# Altium schematic symbol library MiscPower.SchLib: 1552 symbols (part 10 of 22) (continued)
## LM3678SDX-1.2/NOPB (continued)

## LM3679TL-1.8/NOPB
designator U?
3MHz, 350mA Miniature Step-Down DC-DC Converter for Ultra Low Profile Applications (Height < 0.55mm), 5-pin Micro SMD, Pb-Free; PartNumber: LM3679TL-1.8/NOPB; Manufacturer: National Semiconductor; PackageTopMarking: XV*I F; PowerWise: Y; CompType: MiscPower; DatasheetVersion: Feb-2008; PackageVersion: revC, Feb-2005; PackageReference: TLA05EFA; PackageDescription: Thin Micro SMD, 5 Bump (Large), 0.5mm Pitch; RoHS: Y; PinCount: 5; High-Reliability: Y; ComponentLink1Description: Manufacturer URL; ComponentLink1URL: http://www.national.com/; ComponentLink2Description: LM3679 Datasheet; ComponentLink2URL: http://www.national.com/ds/LM/LM3679.pdf; ComponentLink3Description: LM3679 Web Page; ComponentLink3URL: http://www.national.com/pf/LM/LM3679.html; ComponentLink4Description: TLA05EFA Package Page; ComponentLink4URL: http://www.national.com/packaging/folders/tla05efa.html
footprint TLA05EFA (Micro SMD, 5-Leads, Body 1.49x1.11mm, Pitch 0.5mm, NSC Recommended)
pins: A1 VIN (power), A3 GND (power), B2 SW (power), C1 EN (in), C3 FB (in)

## LM3679TLX-1.8/NOPB
designator U?
3MHz, 350mA Miniature Step-Down DC-DC Converter for Ultra Low Profile Applications (Height < 0.55mm), 5-pin Micro SMD, Pb-Free; PartNumber: LM3679TLX-1.8/NOPB; Manufacturer: National Semiconductor; PackageTopMarking: XV*I F; PowerWise: Y; CompType: MiscPower; DatasheetVersion: Feb-2008; PackageVersion: revC, Feb-2005; PackageReference: TLA05EFA; PackageDescription: Thin Micro SMD, 5 Bump (Large), 0.5mm Pitch; RoHS: Y; PinCount: 5; High-Reliability: Y; ComponentLink1Description: Manufacturer URL; ComponentLink1URL: http://www.national.com/; ComponentLink2Description: LM3679 Datasheet; ComponentLink2URL: http://www.national.com/ds/LM/LM3679.pdf; ComponentLink3Description: LM3679 Web Page; ComponentLink3URL: http://www.national.com/pf/LM/LM3679.html; ComponentLink4Description: TLA05EFA Package Page; ComponentLink4URL: http://www.national.com/packaging/folders/tla05efa.html
footprint TLA05EFA (Micro SMD, 5-Leads, Body 1.49x1.11mm, Pitch 0.5mm, NSC Recommended)
pins: A1 VIN (power), A3 GND (power), B2 SW (power), C1 EN (in), C3 FB (in)

## LM3679UR-1.2/NOPB
designator U?
3MHz, 350mA Miniature Step-Down DC-DC Converter for Ultra Low Profile Applications (Height < 0.55mm), 5-pin Micro SMD, Pb-Free; PartNumber: LM3679UR-1.2/NOPB; Manufacturer: National Semiconductor; PackageTopMarking: XV*I Z; PowerWise: N; CompType: MiscPower; High-Reliability: Y; DatasheetVersion: Feb-2008; PackageVersion: Feb-2008; PackageReference: URA05HHA; PackageDescription: Ultra Thin Micro SMD, 5 Bump (Large), 0.5mm Pitch; RoHS: Y; PinCount: 5; ComponentLink1Description: Manufacturer URL; ComponentLink1URL: http://www.national.com/; ComponentLink2Description: LM3679 Datasheet; ComponentLink2URL: http://www.national.com/ds/LM/LM3679.pdf; ComponentLink3Description: LM3679 Web Page; ComponentLink3URL: http://www.national.com/pf/LM/LM3679.html; ComponentLink4Description: URA05HHA Package Page; ComponentLink4URL: http://www.national.com/packaging/folders/ura05hha.html
footprint URA05HHA (Micro SMD, 5-Leads, Body 1.5x1.13mm, Pitch 0.5mm, NSC Recommended)
pins: A1 VIN (power), A3 GND (power), B2 SW (power), C1 EN (in), C3 FB (in)

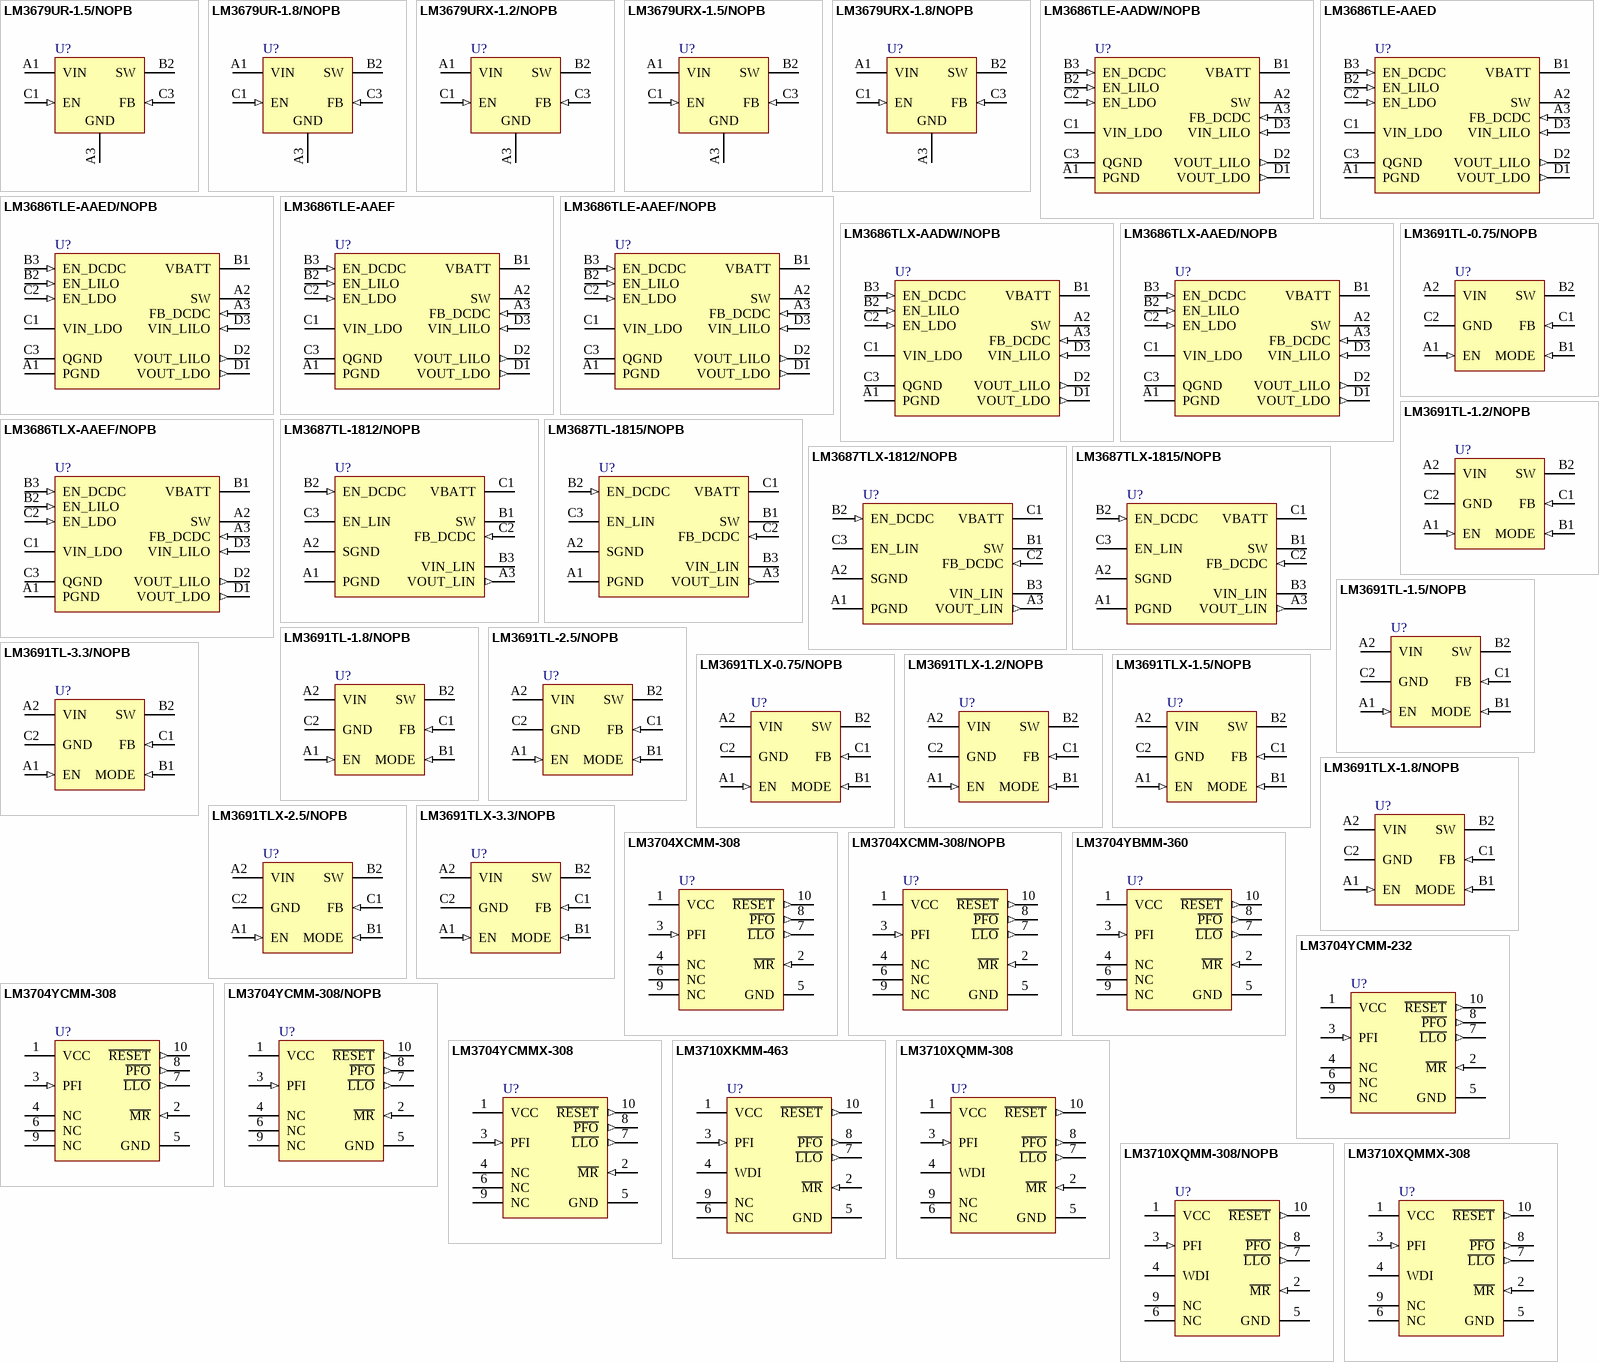
[diagram p23: symbols LM3679UR-1.5/NOPB to LM3710XQMMX-308]

## LM3679UR-1.5/NOPB
designator U?
3MHz, 350mA Miniature Step-Down DC-DC Converter for Ultra Low Profile Applications (Height < 0.55mm), 5-pin Micro SMD, Pb-Free; PartNumber: LM3679UR-1.5/NOPB; Manufacturer: National Semiconductor; PackageTopMarking: XV*I 4; PowerWise: N; CompType: MiscPower; High-Reliability: Y; DatasheetVersion: Feb-2008; PackageVersion: Feb-2008; PackageReference: URA05HHA; PackageDescription: Ultra Thin Micro SMD, 5 Bump (Large), 0.5mm Pitch; RoHS: Y; PinCount: 5; ComponentLink1Description: Manufacturer URL; ComponentLink1URL: http://www.national.com/; ComponentLink2Description: LM3679 Datasheet; ComponentLink2URL: http://www.national.com/ds/LM/LM3679.pdf; ComponentLink3Description: LM3679 Web Page; ComponentLink3URL: http://www.national.com/pf/LM/LM3679.html; ComponentLink4Description: URA05HHA Package Page; ComponentLink4URL: http://www.national.com/packaging/folders/ura05hha.html
footprint URA05HHA (Micro SMD, 5-Leads, Body 1.5x1.13mm, Pitch 0.5mm, NSC Recommended)
pins: A1 VIN (power), A3 GND (power), B2 SW (power), C1 EN (in), C3 FB (in)

## LM3679UR-1.8/NOPB
designator U?
3MHz, 350mA Miniature Step-Down DC-DC Converter for Ultra Low Profile Applications (Height < 0.55mm), 5-pin Micro SMD, Pb-Free; PartNumber: LM3679UR-1.8/NOPB; Manufacturer: National Semiconductor; PackageTopMarking: XV*I R; PowerWise: Y; CompType: MiscPower; DatasheetVersion: Feb-2008; PackageVersion: Feb-2008; PackageReference: URA05HHA; PackageDescription: Ultra Thin Micro SMD, 5 Bump (Large), 0.5mm Pitch; RoHS: Y; PinCount: 5; High-Reliability: Y; ComponentLink1Description: Manufacturer URL; ComponentLink1URL: http://www.national.com/; ComponentLink2Description: LM3679 Datasheet; ComponentLink2URL: http://www.national.com/ds/LM/LM3679.pdf; ComponentLink3Description: LM3679 Web Page; ComponentLink3URL: http://www.national.com/pf/LM/LM3679.html; ComponentLink4Description: URA05HHA Package Page; ComponentLink4URL: http://www.national.com/packaging/folders/ura05hha.html
footprint URA05HHA (Micro SMD, 5-Leads, Body 1.5x1.13mm, Pitch 0.5mm, NSC Recommended)
pins: A1 VIN (power), A3 GND (power), B2 SW (power), C1 EN (in), C3 FB (in)

## LM3679URX-1.2/NOPB
designator U?
3MHz, 350mA Miniature Step-Down DC-DC Converter for Ultra Low Profile Applications (Height < 0.55mm), 5-pin Micro SMD, Pb-Free; PartNumber: LM3679URX-1.2/NOPB; Manufacturer: National Semiconductor; PackageTopMarking: XV*I Z; PowerWise: N; CompType: MiscPower; High-Reliability: Y; DatasheetVersion: Feb-2008; PackageVersion: Feb-2008; PackageReference: URA05HHA; PackageDescription: Ultra Thin Micro SMD, 5 Bump (Large), 0.5mm Pitch; RoHS: Y; PinCount: 5; ComponentLink1Description: Manufacturer URL; ComponentLink1URL: http://www.national.com/; ComponentLink2Description: LM3679 Datasheet; ComponentLink2URL: http://www.national.com/ds/LM/LM3679.pdf; ComponentLink3Description: LM3679 Web Page; ComponentLink3URL: http://www.national.com/pf/LM/LM3679.html; ComponentLink4Description: URA05HHA Package Page; ComponentLink4URL: http://www.national.com/packaging/folders/ura05hha.html
footprint URA05HHA (Micro SMD, 5-Leads, Body 1.5x1.13mm, Pitch 0.5mm, NSC Recommended)
pins: A1 VIN (power), A3 GND (power), B2 SW (power), C1 EN (in), C3 FB (in)

## LM3679URX-1.5/NOPB
designator U?
3MHz, 350mA Miniature Step-Down DC-DC Converter for Ultra Low Profile Applications (Height < 0.55mm), 5-pin Micro SMD, Pb-Free; PartNumber: LM3679URX-1.5/NOPB; Manufacturer: National Semiconductor; PackageTopMarking: XV*I 4; PowerWise: N; CompType: MiscPower; High-Reliability: Y; DatasheetVersion: Feb-2008; PackageVersion: Feb-2008; PackageReference: URA05HHA; PackageDescription: Ultra Thin Micro SMD, 5 Bump (Large), 0.5mm Pitch; RoHS: Y; PinCount: 5; ComponentLink1Description: Manufacturer URL; ComponentLink1URL: http://www.national.com/; ComponentLink2Description: LM3679 Datasheet; ComponentLink2URL: http://www.national.com/ds/LM/LM3679.pdf; ComponentLink3Description: LM3679 Web Page; ComponentLink3URL: http://www.national.com/pf/LM/LM3679.html; ComponentLink4Description: URA05HHA Package Page; ComponentLink4URL: http://www.national.com/packaging/folders/ura05hha.html
footprint URA05HHA (Micro SMD, 5-Leads, Body 1.5x1.13mm, Pitch 0.5mm, NSC Recommended)
pins: A1 VIN (power), A3 GND (power), B2 SW (power), C1 EN (in), C3 FB (in)

## LM3679URX-1.8/NOPB
designator U?
3MHz, 350mA Miniature Step-Down DC-DC Converter for Ultra Low Profile Applications (Height < 0.55mm), 5-pin Micro SMD, Pb-Free; PartNumber: LM3679URX-1.8/NOPB; Manufacturer: National Semiconductor; PackageTopMarking: XV*I R; PowerWise: Y; CompType: MiscPower; DatasheetVersion: Feb-2008; PackageVersion: Feb-2008; PackageReference: URA05HHA; PackageDescription: Ultra Thin Micro SMD, 5 Bump (Large), 0.5mm Pitch; RoHS: Y; PinCount: 5; High-Reliability: Y; ComponentLink1Description: Manufacturer URL; ComponentLink1URL: http://www.national.com/; ComponentLink2Description: LM3679 Datasheet; ComponentLink2URL: http://www.national.com/ds/LM/LM3679.pdf; ComponentLink3Description: LM3679 Web Page; ComponentLink3URL: http://www.national.com/pf/LM/LM3679.html; ComponentLink4Description: URA05HHA Package Page; ComponentLink4URL: http://www.national.com/packaging/folders/ura05hha.html
footprint URA05HHA (Micro SMD, 5-Leads, Body 1.5x1.13mm, Pitch 0.5mm, NSC Recommended)
pins: A1 VIN (power), A3 GND (power), B2 SW (power), C1 EN (in), C3 FB (in)

## LM3686TLE-AADW/NOPB
designator U?
Step-Down DC-DC Converter with Integrated Post Linear Regulators System and Low-Noise Linear Regulator, 12-pin Micro SMD, Pb-Free; PartNumber: LM3686TLE-AADW/NOPB; Manufacturer: National Semiconductor; PackageTopMarking: XYTT*I SUEB; PowerWise: N; CompType: MiscPower; High-Reliability: Y; DatasheetVersion: Dec-2008; PackageVersion: revC, Jan-2004; PackageReference: TLA12HTA; PackageDescription: Thin Micro SMD, 12 Bump (Large), Area Array, 0.5mm Pitch; RoHS: Y; PinCount: 12; Code_JEDEC: MO-211-DE; ComponentLink1Description: Manufacturer URL; ComponentLink1URL: http://www.national.com/; ComponentLink2Description: LM3686 Datasheet; ComponentLink2URL: http://www.national.com/ds/LM/LM3686.pdf; ComponentLink3Description: LM3686 Web Page; ComponentLink3URL: http://www.national.com/pf/LM/LM3686.html; ComponentLink4Description: TLA12HTA Package Page; ComponentLink4URL: http://www.national.com/packaging/folders/tla12hta.html
footprint TLA12HTA (Micro SMD, 12-Leads, Body 2.43x1.69mm, Pitch 0.5mm, NSC Recommended)
pins: A1 PGND (power), A2 SW (power), A3 FB_DCDC (in), B1 VBATT (power), B2 EN_LILO (in), B3 EN_DCDC (in), C1 VIN_LDO (power), C2 EN_LDO (in), C3 QGND (power), D1 VOUT_LDO (out), D2 VOUT_LILO (out), D3 VIN_LILO (in)

## LM3686TLE-AAED
designator U?
Step-Down DC-DC Converter with Integrated Post Linear Regulators System and Low-Noise Linear Regulator, 12-pin Micro SMD; PartNumber: LM3686TLE-AAED; Manufacturer: National Semiconductor; PackageTopMarking: XYTT*I SXTB; PowerWise: N; CompType: MiscPower; High-Reliability: Y; DatasheetVersion: Dec-2008; PackageVersion: revC, Jan-2004; PackageReference: TLA12HTA; PackageDescription: Thin Micro SMD, 12 Bump (Large), Area Array, 0.5mm Pitch; RoHS: Y; PinCount: 12; Code_JEDEC: MO-211-DE; ComponentLink1Description: Manufacturer URL; ComponentLink1URL: http://www.national.com/; ComponentLink2Description: LM3686 Datasheet; ComponentLink2URL: http://www.national.com/ds/LM/LM3686.pdf; ComponentLink3Description: LM3686 Web Page; ComponentLink3URL: http://www.national.com/pf/LM/LM3686.html; ComponentLink4Description: TLA12HTA Package Page; ComponentLink4URL: http://www.national.com/packaging/folders/tla12hta.html
footprint TLA12HTA (Micro SMD, 12-Leads, Body 2.43x1.69mm, Pitch 0.5mm, NSC Recommended)
pins: A1 PGND (power), A2 SW (power), A3 FB_DCDC (in), B1 VBATT (power), B2 EN_LILO (in), B3 EN_DCDC (in), C1 VIN_LDO (power), C2 EN_LDO (in), C3 QGND (power), D1 VOUT_LDO (out), D2 VOUT_LILO (out), D3 VIN_LILO (in)

## LM3686TLE-AAED/NOPB
designator U?
Step-Down DC-DC Converter with Integrated Post Linear Regulators System and Low-Noise Linear Regulator, 12-pin Micro SMD, Pb-Free; PartNumber: LM3686TLE-AAED/NOPB; Manufacturer: National Semiconductor; PackageTopMarking: XYTT*I SXTB; PowerWise: N; CompType: MiscPower; High-Reliability: Y; DatasheetVersion: Dec-2008; PackageVersion: revC, Jan-2004; PackageReference: TLA12HTA; PackageDescription: Thin Micro SMD, 12 Bump (Large), Area Array, 0.5mm Pitch; RoHS: Y; PinCount: 12; Code_JEDEC: MO-211-DE; ComponentLink1Description: Manufacturer URL; ComponentLink1URL: http://www.national.com/; ComponentLink2Description: LM3686 Datasheet; ComponentLink2URL: http://www.national.com/ds/LM/LM3686.pdf; ComponentLink3Description: LM3686 Web Page; ComponentLink3URL: http://www.national.com/pf/LM/LM3686.html; ComponentLink4Description: TLA12HTA Package Page; ComponentLink4URL: http://www.national.com/packaging/folders/tla12hta.html
footprint TLA12HTA (Micro SMD, 12-Leads, Body 2.43x1.69mm, Pitch 0.5mm, NSC Recommended)
pins: A1 PGND (power), A2 SW (power), A3 FB_DCDC (in), B1 VBATT (power), B2 EN_LILO (in), B3 EN_DCDC (in), C1 VIN_LDO (power), C2 EN_LDO (in), C3 QGND (power), D1 VOUT_LDO (out), D2 VOUT_LILO (out), D3 VIN_LILO (in)

## LM3686TLE-AAEF
designator U?
Step-Down DC-DC Converter with Integrated Post Linear Regulators System and Low-Noise Linear Regulator, 12-pin Micro SMD; PartNumber: LM3686TLE-AAEF; Manufacturer: National Semiconductor; PackageTopMarking: XYTT*I SXZB; PowerWise: N; CompType: MiscPower; High-Reliability: Y; DatasheetVersion: Dec-2008; PackageVersion: revC, Jan-2004; PackageReference: TLA12HTA; PackageDescription: Thin Micro SMD, 12 Bump (Large), Area Array, 0.5mm Pitch; RoHS: Y; PinCount: 12; Code_JEDEC: MO-211-DE; ComponentLink1Description: Manufacturer URL; ComponentLink1URL: http://www.national.com/; ComponentLink2Description: LM3686 Datasheet; ComponentLink2URL: http://www.national.com/ds/LM/LM3686.pdf; ComponentLink3Description: LM3686 Web Page; ComponentLink3URL: http://www.national.com/pf/LM/LM3686.html; ComponentLink4Description: TLA12HTA Package Page; ComponentLink4URL: http://www.national.com/packaging/folders/tla12hta.html
footprint TLA12HTA (Micro SMD, 12-Leads, Body 2.43x1.69mm, Pitch 0.5mm, NSC Recommended)
pins: A1 PGND (power), A2 SW (power), A3 FB_DCDC (in), B1 VBATT (power), B2 EN_LILO (in), B3 EN_DCDC (in), C1 VIN_LDO (power), C2 EN_LDO (in), C3 QGND (power), D1 VOUT_LDO (out), D2 VOUT_LILO (out), D3 VIN_LILO (in)

## LM3686TLE-AAEF/NOPB
designator U?
Step-Down DC-DC Converter with Integrated Post Linear Regulators System and Low-Noise Linear Regulator, 12-pin Micro SMD, Pb-Free; PartNumber: LM3686TLE-AAEF/NOPB; Manufacturer: National Semiconductor; PackageTopMarking: XYTT*I SXZB; PowerWise: N; CompType: MiscPower; High-Reliability: Y; DatasheetVersion: Dec-2008; PackageVersion: revC, Jan-2004; PackageReference: TLA12HTA; PackageDescription: Thin Micro SMD, 12 Bump (Large), Area Array, 0.5mm Pitch; RoHS: Y; PinCount: 12; Code_JEDEC: MO-211-DE; ComponentLink1Description: Manufacturer URL; ComponentLink1URL: http://www.national.com/; ComponentLink2Description: LM3686 Datasheet; ComponentLink2URL: http://www.national.com/ds/LM/LM3686.pdf; ComponentLink3Description: LM3686 Web Page; ComponentLink3URL: http://www.national.com/pf/LM/LM3686.html; ComponentLink4Description: TLA12HTA Package Page; ComponentLink4URL: http://www.national.com/packaging/folders/tla12hta.html
footprint TLA12HTA (Micro SMD, 12-Leads, Body 2.43x1.69mm, Pitch 0.5mm, NSC Recommended)
pins: A1 PGND (power), A2 SW (power), A3 FB_DCDC (in), B1 VBATT (power), B2 EN_LILO (in), B3 EN_DCDC (in), C1 VIN_LDO (power), C2 EN_LDO (in), C3 QGND (power), D1 VOUT_LDO (out), D2 VOUT_LILO (out), D3 VIN_LILO (in)

## LM3686TLX-AADW/NOPB
designator U?
Step-Down DC-DC Converter with Integrated Post Linear Regulators System and Low-Noise Linear Regulator, 12-pin Micro SMD, Pb-Free; PartNumber: LM3686TLX-AADW/NOPB; Manufacturer: National Semiconductor; PackageTopMarking: XYTT*I SUEB; PowerWise: N; CompType: MiscPower; High-Reliability: Y; DatasheetVersion: Dec-2008; PackageVersion: revC, Jan-2004; PackageReference: TLA12HTA; PackageDescription: Thin Micro SMD, 12 Bump (Large), Area Array, 0.5mm Pitch; RoHS: Y; PinCount: 12; Code_JEDEC: MO-211-DE; ComponentLink1Description: Manufacturer URL; ComponentLink1URL: http://www.national.com/; ComponentLink2Description: LM3686 Datasheet; ComponentLink2URL: http://www.national.com/ds/LM/LM3686.pdf; ComponentLink3Description: LM3686 Web Page; ComponentLink3URL: http://www.national.com/pf/LM/LM3686.html; ComponentLink4Description: TLA12HTA Package Page; ComponentLink4URL: http://www.national.com/packaging/folders/tla12hta.html
footprint TLA12HTA (Micro SMD, 12-Leads, Body 2.43x1.69mm, Pitch 0.5mm, NSC Recommended)
pins: A1 PGND (power), A2 SW (power), A3 FB_DCDC (in), B1 VBATT (power), B2 EN_LILO (in), B3 EN_DCDC (in), C1 VIN_LDO (power), C2 EN_LDO (in), C3 QGND (power), D1 VOUT_LDO (out), D2 VOUT_LILO (out), D3 VIN_LILO (in)

## LM3686TLX-AAED/NOPB
designator U?
Step-Down DC-DC Converter with Integrated Post Linear Regulators System and Low-Noise Linear Regulator, 12-pin Micro SMD, Pb-Free; PartNumber: LM3686TLX-AAED/NOPB; Manufacturer: National Semiconductor; PackageTopMarking: XYTT*I SXTB; PowerWise: N; CompType: MiscPower; High-Reliability: Y; DatasheetVersion: Dec-2008; PackageVersion: revC, Jan-2004; PackageReference: TLA12HTA; PackageDescription: Thin Micro SMD, 12 Bump (Large), Area Array, 0.5mm Pitch; RoHS: Y; PinCount: 12; Code_JEDEC: MO-211-DE; ComponentLink1Description: Manufacturer URL; ComponentLink1URL: http://www.national.com/; ComponentLink2Description: LM3686 Datasheet; ComponentLink2URL: http://www.national.com/ds/LM/LM3686.pdf; ComponentLink3Description: LM3686 Web Page; ComponentLink3URL: http://www.national.com/pf/LM/LM3686.html; ComponentLink4Description: TLA12HTA Package Page; ComponentLink4URL: http://www.national.com/packaging/folders/tla12hta.html
footprint TLA12HTA (Micro SMD, 12-Leads, Body 2.43x1.69mm, Pitch 0.5mm, NSC Recommended)
pins: A1 PGND (power), A2 SW (power), A3 FB_DCDC (in), B1 VBATT (power), B2 EN_LILO (in), B3 EN_DCDC (in), C1 VIN_LDO (power), C2 EN_LDO (in), C3 QGND (power), D1 VOUT_LDO (out), D2 VOUT_LILO (out), D3 VIN_LILO (in)

## LM3686TLX-AAEF/NOPB
designator U?
Step-Down DC-DC Converter with Integrated Post Linear Regulators System and Low-Noise Linear Regulator, 12-pin Micro SMD, Pb-Free; PartNumber: LM3686TLX-AAEF/NOPB; Manufacturer: National Semiconductor; PackageTopMarking: XYTT*I SXZB; PowerWise: N; CompType: MiscPower; High-Reliability: Y; DatasheetVersion: Dec-2008; PackageVersion: revC, Jan-2004; PackageReference: TLA12HTA; PackageDescription: Thin Micro SMD, 12 Bump (Large), Area Array, 0.5mm Pitch; RoHS: Y; PinCount: 12; Code_JEDEC: MO-211-DE; ComponentLink1Description: Manufacturer URL; ComponentLink1URL: http://www.national.com/; ComponentLink2Description: LM3686 Datasheet; ComponentLink2URL: http://www.national.com/ds/LM/LM3686.pdf; ComponentLink3Description: LM3686 Web Page; ComponentLink3URL: http://www.national.com/pf/LM/LM3686.html; ComponentLink4Description: TLA12HTA Package Page; ComponentLink4URL: http://www.national.com/packaging/folders/tla12hta.html
footprint TLA12HTA (Micro SMD, 12-Leads, Body 2.43x1.69mm, Pitch 0.5mm, NSC Recommended)
pins: A1 PGND (power), A2 SW (power), A3 FB_DCDC (in), B1 VBATT (power), B2 EN_LILO (in), B3 EN_DCDC (in), C1 VIN_LDO (power), C2 EN_LDO (in), C3 QGND (power), D1 VOUT_LDO (out), D2 VOUT_LILO (out), D3 VIN_LILO (in)

## LM3687TL-1812/NOPB
designator U?
Step-Down DC-DC Converter with Integrated Low Dropout Regulator and Startup Mode, 9-pin Micro SMD, Pb-Free; PartNumber: LM3687TL-1812/NOPB; Manufacturer: National Semiconductor; PackageTopMarking: XV*I SB; PowerWise: N; CompType: MiscPower; High-Reliability: Y; DatasheetVersion: Jul-2008; PackageVersion: revC, Jan-2004; PackageReference: TLA09BBA; PackageDescription: Thin Micro SMD, 9 Bump (Large), 0.5mm Pitch; RoHS: Y; PinCount: 9; Code_JEDEC: MO-211-DD; ComponentLink1Description: Manufacturer URL; ComponentLink1URL: http://www.national.com/; ComponentLink2Description: LM3687 Datasheet; ComponentLink2URL: http://www.national.com/ds/LM/LM3687.pdf; ComponentLink3Description: LM3687 Web Page; ComponentLink3URL: http://www.national.com/pf/LM/LM3687.html; ComponentLink4Description: TLA09BBA Package Page; ComponentLink4URL: http://www.national.com/packaging/folders/tla09bba.html
footprint TLA09BBA (Micro SMD, 9-Leads, Body 1.54x1.54mm, Pitch 0.5mm, NSC Recommended)
pins: A1 PGND (power), A2 SGND (power), A3 VOUT_LIN (out), B1 SW (power), B2 EN_DCDC (in), B3 VIN_LIN (power), C1 VBATT (power), C2 FB_DCDC (in), C3 EN_LIN (power)

## LM3687TL-1815/NOPB
designator U?
Step-Down DC-DC Converter with Integrated Low Dropout Regulator and Startup Mode, 9-pin Micro SMD, Pb-Free; PartNumber: LM3687TL-1815/NOPB; Manufacturer: National Semiconductor; PackageTopMarking: XV*I S9; PowerWise: Y; CompType: MiscPower; DatasheetVersion: Jul-2008; PackageVersion: revC, Jan-2004; PackageReference: TLA09BBA; PackageDescription: Thin Micro SMD, 9 Bump (Large), 0.5mm Pitch; RoHS: Y; PinCount: 9; High-Reliability: Y; Code_JEDEC: MO-211-DD; ComponentLink1Description: Manufacturer URL; ComponentLink1URL: http://www.national.com/; ComponentLink2Description: LM3687 Datasheet; ComponentLink2URL: http://www.national.com/ds/LM/LM3687.pdf; ComponentLink3Description: LM3687 Web Page; ComponentLink3URL: http://www.national.com/pf/LM/LM3687.html; ComponentLink4Description: TLA09BBA Package Page; ComponentLink4URL: http://www.national.com/packaging/folders/tla09bba.html
footprint TLA09BBA (Micro SMD, 9-Leads, Body 1.54x1.54mm, Pitch 0.5mm, NSC Recommended)
pins: A1 PGND (power), A2 SGND (power), A3 VOUT_LIN (out), B1 SW (power), B2 EN_DCDC (in), B3 VIN_LIN (power), C1 VBATT (power), C2 FB_DCDC (in), C3 EN_LIN (power)

## LM3687TLX-1812/NOPB
designator U?
Step-Down DC-DC Converter with Integrated Low Dropout Regulator and Startup Mode, 9-pin Micro SMD, Pb-Free; PartNumber: LM3687TLX-1812/NOPB; Manufacturer: National Semiconductor; PackageTopMarking: XV*I SB; PowerWise: N; CompType: MiscPower; High-Reliability: Y; DatasheetVersion: Jul-2008; PackageVersion: revC, Jan-2004; PackageReference: TLA09BBA; PackageDescription: Thin Micro SMD, 9 Bump (Large), 0.5mm Pitch; RoHS: Y; PinCount: 9; Code_JEDEC: MO-211-DD; ComponentLink1Description: Manufacturer URL; ComponentLink1URL: http://www.national.com/; ComponentLink2Description: LM3687 Datasheet; ComponentLink2URL: http://www.national.com/ds/LM/LM3687.pdf; ComponentLink3Description: LM3687 Web Page; ComponentLink3URL: http://www.national.com/pf/LM/LM3687.html; ComponentLink4Description: TLA09BBA Package Page; ComponentLink4URL: http://www.national.com/packaging/folders/tla09bba.html
footprint TLA09BBA (Micro SMD, 9-Leads, Body 1.54x1.54mm, Pitch 0.5mm, NSC Recommended)
pins: A1 PGND (power), A2 SGND (power), A3 VOUT_LIN (out), B1 SW (power), B2 EN_DCDC (in), B3 VIN_LIN (power), C1 VBATT (power), C2 FB_DCDC (in), C3 EN_LIN (power)

## LM3687TLX-1815/NOPB
designator U?
Step-Down DC-DC Converter with Integrated Low Dropout Regulator and Startup Mode, 9-pin Micro SMD, Pb-Free; PartNumber: LM3687TLX-1815/NOPB; Manufacturer: National Semiconductor; PackageTopMarking: XV*I S9; PowerWise: Y; CompType: MiscPower; DatasheetVersion: Jul-2008; PackageVersion: revC, Jan-2004; PackageReference: TLA09BBA; PackageDescription: Thin Micro SMD, 9 Bump (Large), 0.5mm Pitch; RoHS: Y; PinCount: 9; High-Reliability: Y; Code_JEDEC: MO-211-DD; ComponentLink1Description: Manufacturer URL; ComponentLink1URL: http://www.national.com/; ComponentLink2Description: LM3687 Datasheet; ComponentLink2URL: http://www.national.com/ds/LM/LM3687.pdf; ComponentLink3Description: LM3687 Web Page; ComponentLink3URL: http://www.national.com/pf/LM/LM3687.html; ComponentLink4Description: TLA09BBA Package Page; ComponentLink4URL: http://www.national.com/packaging/folders/tla09bba.html
footprint TLA09BBA (Micro SMD, 9-Leads, Body 1.54x1.54mm, Pitch 0.5mm, NSC Recommended)
pins: A1 PGND (power), A2 SGND (power), A3 VOUT_LIN (out), B1 SW (power), B2 EN_DCDC (in), B3 VIN_LIN (power), C1 VBATT (power), C2 FB_DCDC (in), C3 EN_LIN (power)

## LM3691TL-0.75/NOPB
designator U?
High Accuracy, Miniature 1A, Step-Down DC-DC Converter for Portable Applications, 6-pin Micro SMD, Pb-Free; PartNumber: LM3691TL-0.75/NOPB; Manufacturer: National Semiconductor; PackageTopMarking: XV*I V; PowerWise: Y; CompType: MiscPower; DatasheetVersion: Jan-2011; PackageVersion: revC, Jan-2004; PackageReference: TLA06LCA; PackageDescription: Thin Micro SMD, 6 Bump (Large), 0.5mm Pitch; RoHS: Y; PinCount: 6; High-Reliability: Y; Code_JEDEC: MO-211-DB; ComponentLink1Description: Manufacturer URL; ComponentLink1URL: http://www.national.com/; ComponentLink2Description: LM3691 Datasheet; ComponentLink2URL: http://www.national.com/ds/LM/LM3691.pdf; ComponentLink3Description: LM3691 Web Page; ComponentLink3URL: http://www.national.com/pf/LM/LM3691.html; ComponentLink4Description: TLA06LCA Package Page; ComponentLink4URL: http://www.national.com/packaging/folders/tla06lca.html
footprint TLA06LCA (Micro SMD, 6-Leads, Body 1.57x1.26mm, Pitch 0.5mm, NSC Recommended)
pins: A1 EN (in), A2 VIN (power), B1 MODE (in), B2 SW (power), C1 FB (in), C2 GND (power)

## LM3691TL-1.2/NOPB
designator U?
High Accuracy, Miniature 1A, Step-Down DC-DC Converter for Portable Applications, 6-pin Micro SMD, Pb-Free; PartNumber: LM3691TL-1.2/NOPB; Manufacturer: National Semiconductor; PackageTopMarking: XV*I X; PowerWise: Y; CompType: MiscPower; DatasheetVersion: Jan-2011; PackageVersion: revC, Jan-2004; PackageReference: TLA06LCA; PackageDescription: Thin Micro SMD, 6 Bump (Large), 0.5mm Pitch; RoHS: Y; PinCount: 6; High-Reliability: Y; Code_JEDEC: MO-211-DB; ComponentLink1Description: Manufacturer URL; ComponentLink1URL: http://www.national.com/; ComponentLink2Description: LM3691 Datasheet; ComponentLink2URL: http://www.national.com/ds/LM/LM3691.pdf; ComponentLink3Description: LM3691 Web Page; ComponentLink3URL: http://www.national.com/pf/LM/LM3691.html; ComponentLink4Description: TLA06LCA Package Page; ComponentLink4URL: http://www.national.com/packaging/folders/tla06lca.html
footprint TLA06LCA (Micro SMD, 6-Leads, Body 1.57x1.26mm, Pitch 0.5mm, NSC Recommended)
pins: A1 EN (in), A2 VIN (power), B1 MODE (in), B2 SW (power), C1 FB (in), C2 GND (power)

## LM3691TL-1.5/NOPB
designator U?
High Accuracy, Miniature 1A, Step-Down DC-DC Converter for Portable Applications, 6-pin Micro SMD, Pb-Free; PartNumber: LM3691TL-1.5/NOPB; Manufacturer: National Semiconductor; PackageTopMarking: XV*I Y; PowerWise: Y; CompType: MiscPower; DatasheetVersion: Jan-2011; PackageVersion: revC, Jan-2004; PackageReference: TLA06LCA; PackageDescription: Thin Micro SMD, 6 Bump (Large), 0.5mm Pitch; RoHS: Y; PinCount: 6; High-Reliability: Y; Code_JEDEC: MO-211-DB; ComponentLink1Description: Manufacturer URL; ComponentLink1URL: http://www.national.com/; ComponentLink2Description: LM3691 Datasheet; ComponentLink2URL: http://www.national.com/ds/LM/LM3691.pdf; ComponentLink3Description: LM3691 Web Page; ComponentLink3URL: http://www.national.com/pf/LM/LM3691.html; ComponentLink4Description: TLA06LCA Package Page; ComponentLink4URL: http://www.national.com/packaging/folders/tla06lca.html
footprint TLA06LCA (Micro SMD, 6-Leads, Body 1.57x1.26mm, Pitch 0.5mm, NSC Recommended)
pins: A1 EN (in), A2 VIN (power), B1 MODE (in), B2 SW (power), C1 FB (in), C2 GND (power)

## LM3691TL-1.8/NOPB
designator U?
High Accuracy, Miniature 1A, Step-Down DC-DC Converter for Portable Applications, 6-pin Micro SMD, Pb-Free; PartNumber: LM3691TL-1.8/NOPB; Manufacturer: National Semiconductor; PackageTopMarking: XV*I Z; PowerWise: Y; CompType: MiscPower; DatasheetVersion: Jan-2011; PackageVersion: revC, Jan-2004; PackageReference: TLA06LCA; PackageDescription: Thin Micro SMD, 6 Bump (Large), 0.5mm Pitch; RoHS: Y; PinCount: 6; High-Reliability: Y; Code_JEDEC: MO-211-DB; ComponentLink1Description: Manufacturer URL; ComponentLink1URL: http://www.national.com/; ComponentLink2Description: LM3691 Datasheet; ComponentLink2URL: http://www.national.com/ds/LM/LM3691.pdf; ComponentLink3Description: LM3691 Web Page; ComponentLink3URL: http://www.national.com/pf/LM/LM3691.html; ComponentLink4Description: TLA06LCA Package Page; ComponentLink4URL: http://www.national.com/packaging/folders/tla06lca.html
footprint TLA06LCA (Micro SMD, 6-Leads, Body 1.57x1.26mm, Pitch 0.5mm, NSC Recommended)
pins: A1 EN (in), A2 VIN (power), B1 MODE (in), B2 SW (power), C1 FB (in), C2 GND (power)